# Altium footprint library MYLIB.PcbLib: 600 footprints (part 31 of 39)
Each footprint in its own frame and in the unit in brackets; x right, y up, seen from the top. Pads: shape width x height; smd on the part's side, far side on the other; paste and mask are expansions set on the pad; w line width, h text height; cw(c..) or ccw(c..) is an arc to the next point about the centre after c.
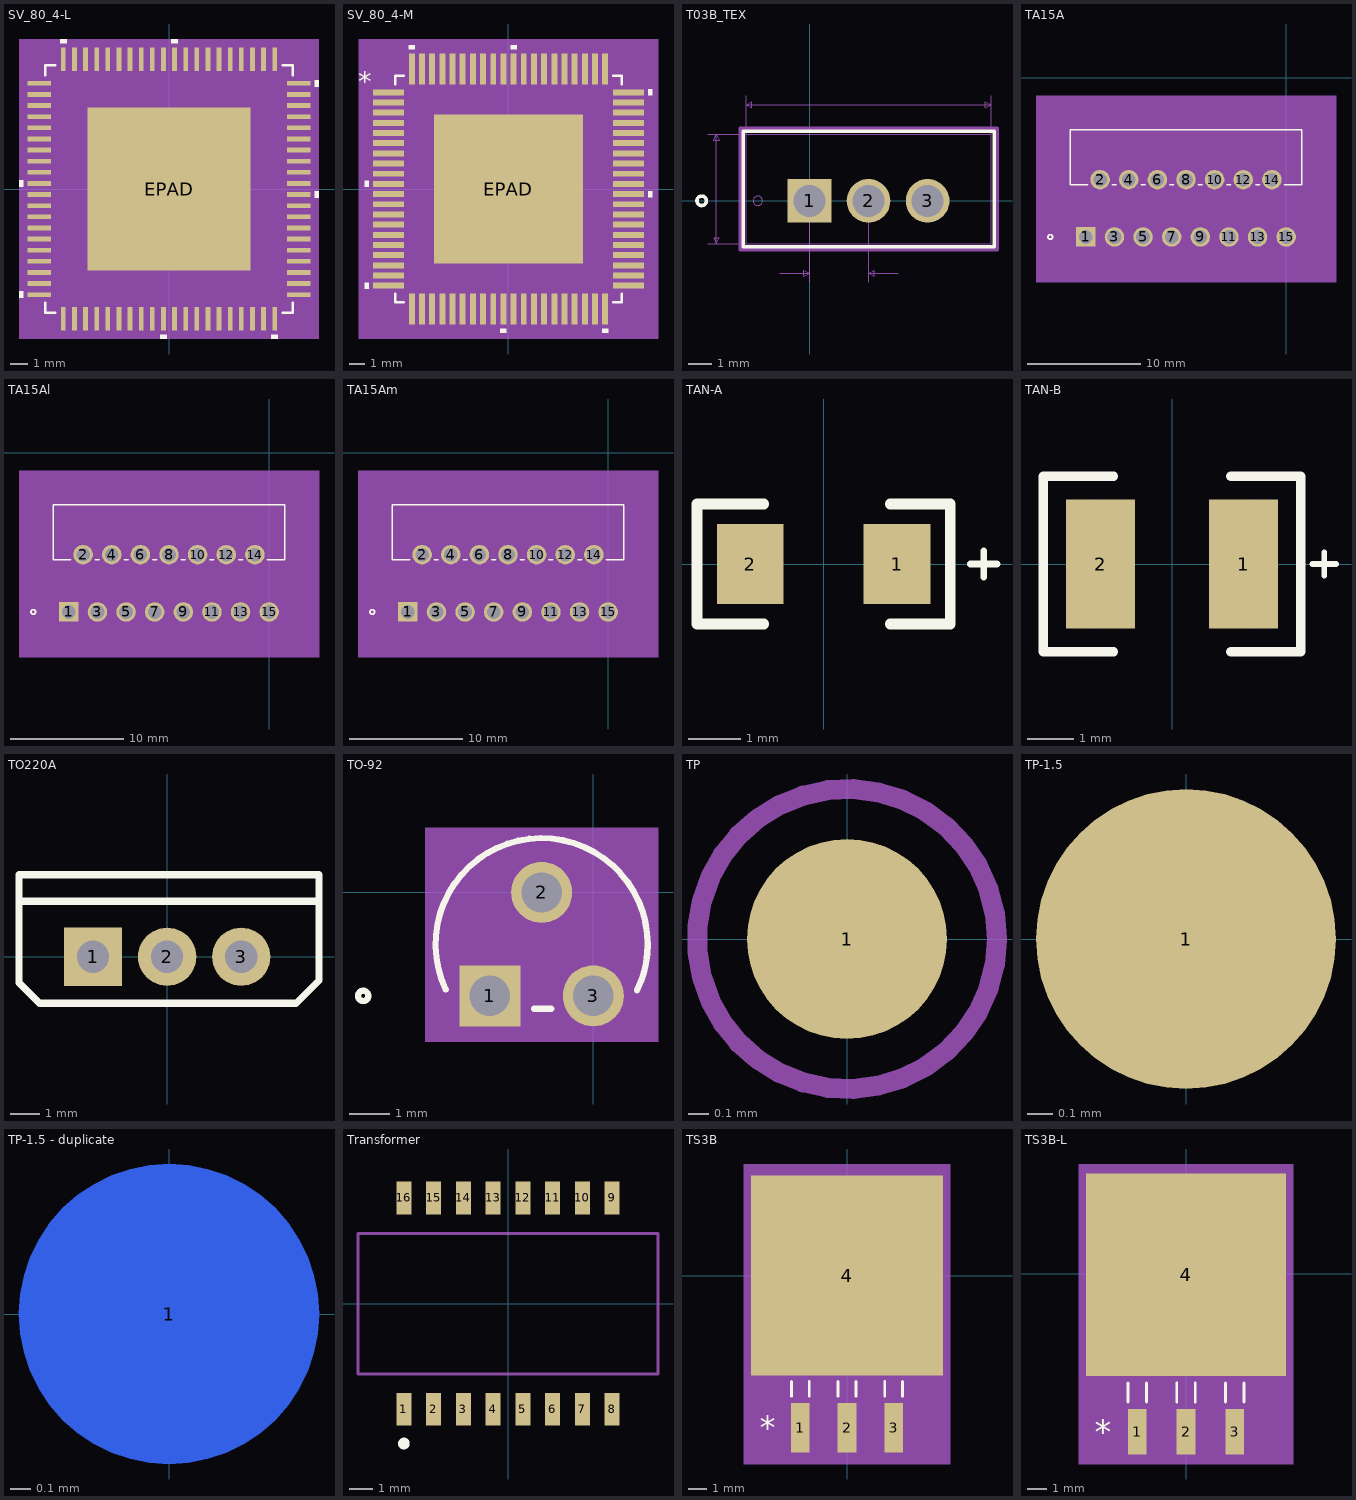
[diagram p30: the footprints below, top view; thin cyan lines are the x and y axes]

## SV_80_4-L [mil]
pads (81):
  rect 54x11 smd paste+0 mask+0: 1(-298,243.11) 2(-298,217.52) 3(-298,191.93) 4(-298,166.34) 5(-298,140.75) 6(-298,115.16) 7(-298,89.57) 8(-298,63.98) 9(-298,38.39) 10(-298,12.8) 11(-298,-12.8) 12(-298,-38.39) 13(-298,-63.98) 14(-298,-89.57) 15(-298,-115.16) 16(-298,-140.75) 17(-298,-166.34) 18(-298,-191.93) 19(-298,-217.52) 20(-298,-243.11) 41(298,-243.11) 42(298,-217.52) 43(298,-191.93) 44(298,-166.34) 45(298,-140.75) 46(298,-115.16) 47(298,-89.57) 48(298,-63.98) 49(298,-38.39) 50(298,-12.8) 51(298,12.8) 52(298,38.39) 53(298,63.98) 54(298,89.57) 55(298,115.16) 56(298,140.75) 57(298,166.34) 58(298,191.93) 59(298,217.52) 60(298,243.11)
  rect 11x54 smd paste+0 mask+0: 21(-243.11,-298) 22(-217.52,-298) 23(-191.93,-298) 24(-166.34,-298) 25(-140.75,-298) 26(-115.16,-298) 27(-89.57,-298) 28(-63.98,-298) 29(-38.39,-298) 30(-12.8,-298) 31(12.8,-298) 32(38.39,-298) 33(63.98,-298) 34(89.57,-298) 35(115.16,-298) 36(140.75,-298) 37(166.34,-298) 38(191.93,-298) 39(217.52,-298) 40(243.11,-298) 61(243.11,298) 62(217.52,298) 63(191.93,298) 64(166.34,298) 65(140.75,298) 66(115.16,298) 67(89.57,298) 68(63.98,298) 69(38.39,298) 70(12.8,298) 71(-12.8,298) 72(-38.39,298) 73(-63.98,298) 74(-89.57,298) 75(-115.16,298) 76(-140.75,298) 77(-166.34,298) 78(-191.93,298) 79(-217.52,298) 80(-243.11,298)
  rect 374x374 smd paste-186.5 mask+0: EPAD(0,0)
Top Overlay:
  region: -335,20.3 -345,20.3 -345,5.3 -335,5.3
  region: -335,-235.61 -345,-235.61 -345,-250.61 -335,-250.61
  region: -5.3,-335 -20.3,-335 -20.3,-345 -5.3,-345
  region: 250.61,-335 235.61,-335 235.61,-345 250.61,-345
  region: 335,-5.3 345,-5.3 345,-20.3 335,-20.3
  region: 335,250.61 345,250.61 345,235.61 335,235.61
  region: 20.3,335 5.3,335 5.3,345 20.3,345
  region: -235.61,335 -250.61,335 -250.61,345 -235.61,345
  lines w6: -284.5,-261.71 -284.5,-284.5 -261.71,-284.5 ; -284.5,261.71 -284.5,284.5 -261.71,284.5 ; 261.71,-284.5 284.5,-284.5 284.5,-261.71 ; 261.71,284.5 284.5,284.5 284.5,261.71
Top Paste:
  drawing of 49 lines, arcs and shapes, not listed
Mechanical 5:
  region: 344,-344 -344,-344 -344,344 344,344
Mechanical 13:
  drawing of 325 lines, arcs and shapes, not listed
  text "*" at -277,230.91 h50
Mechanical 15:
  region: -252.61,-283.5 -283.5,-283.5 -283.5,-252.61 -329,-252.61 -329,252.61 -283.5,252.61 -283.5,283.5 -252.61,283.5 -252.61,329 252.61,329 252.61,283.5 283.5,283.5 283.5,252.61 329,252.61 329,-252.61 283.5,-252.61 283.5,-283.5 252.61,-283.5 252.61,-329 -252.61,-329
  lines w6: -329,-252.61 -283.5,-252.61 -283.5,-283.5 -252.61,-283.5 -252.61,-329 252.61,-329 252.61,-283.5 283.5,-283.5 283.5,-252.61 329,-252.61 329,252.61 283.5,252.61 283.5,283.5 252.61,283.5 252.61,329 -252.61,329 -252.61,283.5 -283.5,283.5 -283.5,252.61 -329,252.61 -329,-252.61
3D body: height 10, standoff 0, extent 0,0 10,10

## SV_80_4-M [mil]
pads (81):
  rect 78x15 smd paste+0 mask+0: 1(-302,243.11) 2(-302,217.52) 3(-302,191.93) 4(-302,166.34) 5(-302,140.75) 6(-302,115.16) 7(-302,89.57) 8(-302,63.98) 9(-302,38.39) 10(-302,12.8) 11(-302,-12.8) 12(-302,-38.39) 13(-302,-63.98) 14(-302,-89.57) 15(-302,-115.16) 16(-302,-140.75) 17(-302,-166.34) 18(-302,-191.93) 19(-302,-217.52) 20(-302,-243.11) 41(302,-243.11) 42(302,-217.52) 43(302,-191.93) 44(302,-166.34) 45(302,-140.75) 46(302,-115.16) 47(302,-89.57) 48(302,-63.98) 49(302,-38.39) 50(302,-12.8) 51(302,12.8) 52(302,38.39) 53(302,63.98) 54(302,89.57) 55(302,115.16) 56(302,140.75) 57(302,166.34) 58(302,191.93) 59(302,217.52) 60(302,243.11)
  rect 15x78 smd paste+0 mask+0: 21(-243.11,-302) 22(-217.52,-302) 23(-191.93,-302) 24(-166.34,-302) 25(-140.75,-302) 26(-115.16,-302) 27(-89.57,-302) 28(-63.98,-302) 29(-38.39,-302) 30(-12.8,-302) 31(12.8,-302) 32(38.39,-302) 33(63.98,-302) 34(89.57,-302) 35(115.16,-302) 36(140.75,-302) 37(166.34,-302) 38(191.93,-302) 39(217.52,-302) 40(243.11,-302) 61(243.11,302) 62(217.52,302) 63(191.93,302) 64(166.34,302) 65(140.75,302) 66(115.16,302) 67(89.57,302) 68(63.98,302) 69(38.39,302) 70(12.8,302) 71(-12.8,302) 72(-38.39,302) 73(-63.98,302) 74(-89.57,302) 75(-115.16,302) 76(-140.75,302) 77(-166.34,302) 78(-191.93,302) 79(-217.52,302) 80(-243.11,302)
  rect 374x374 smd paste-186.5 mask+0: EPAD(0,0)
Top Overlay:
  region: -351,20.3 -361,20.3 -361,5.3 -351,5.3
  region: -351,-235.61 -361,-235.61 -361,-250.61 -351,-250.61
  region: -5.3,-351 -20.3,-351 -20.3,-361 -5.3,-361
  region: 250.61,-351 235.61,-351 235.61,-361 250.61,-361
  region: 351,-5.3 361,-5.3 361,-20.3 351,-20.3
  region: 351,250.61 361,250.61 361,235.61 351,235.61
  region: 20.3,351 5.3,351 5.3,361 20.3,361
  region: -235.61,351 -250.61,351 -250.61,361 -235.61,361
  lines w6: -284.5,-263.71 -284.5,-284.5 -263.71,-284.5 ; -284.5,263.71 -284.5,284.5 -263.71,284.5 ; 263.71,-284.5 284.5,-284.5 284.5,-263.71 ; 263.71,284.5 284.5,284.5 284.5,263.71
  text "*" at -378.5,245.91 h50
Top Paste:
  drawing of 49 lines, arcs and shapes, not listed
Mechanical 5:
  region: 376,-376 -376,-376 -376,376 376,376
Mechanical 13:
  drawing of 325 lines, arcs and shapes, not listed
  text "*" at -277,230.91 h50
Mechanical 15:
  region: -270.61,-299.5 -299.5,-299.5 -299.5,-270.61 -361,-270.61 -361,270.61 -299.5,270.61 -299.5,299.5 -270.61,299.5 -270.61,361 270.61,361 270.61,299.5 299.5,299.5 299.5,270.61 361,270.61 361,-270.61 299.5,-270.61 299.5,-299.5 270.61,-299.5 270.61,-361 -270.61,-361
  lines w6: -361,-270.61 -299.5,-270.61 -299.5,-299.5 -270.61,-299.5 -270.61,-361 270.61,-361 270.61,-299.5 299.5,-299.5 299.5,-270.61 361,-270.61 361,270.61 299.5,270.61 299.5,299.5 270.61,299.5 270.61,361 -270.61,361 -270.61,299.5 -299.5,299.5 -299.5,270.61 -361,270.61 -361,-270.61
3D body: height 10, standoff 0, extent 0,0 10,10

## T03B_TEX [mil]
pads (3):
  rect 74x74 hole 54: 1(0,0)
  round 74 hole 54: 2(100,0) 3(200,0)
Top Overlay:
  circle w6: c-182.5,0 r8
  lines w6: -112.5,-77.5 312.5,-77.5 312.5,117.5 -112.5,117.5 -112.5,-77.5
Mechanical 7:
  lines w1: -172.5,-72.5 -107.5,-72.5 ; -172.5,112.5 -107.5,112.5 ; -107.5,20 -107.5,177.5 ; -50,-122.5 0,-122.5 ; 0,-137.5 0,0 ; 100,-137.5 100,0 ; 150,-122.5 100,-122.5 ; 307.5,20 307.5,177.5 ; -157.5,-72.5 -157.5,112.5 ; -157.5,-72.5 -162.5,-62.5 -152.5,-62.5 -157.5,-72.5 ; -157.5,112.5 -162.5,102.5 -152.5,102.5 -157.5,112.5 ; -107.5,162.5 307.5,162.5 ; -107.5,162.5 -97.5,167.5 -97.5,157.5 -107.5,162.5 ; 0,-122.5 -10,-117.5 -10,-127.5 0,-122.5 ; 100,-122.5 110,-117.5 110,-127.5 100,-122.5 ; 307.5,162.5 297.5,167.5 297.5,157.5 307.5,162.5
  text "0.415in/10.541mm" at 0,182.5 h25
  text "0.1in/2.54mm" at -25,-167.5 h25
Mechanical 13:
  circle w0: c-87.5,0 r8
  lines w1: -107.5,-72.5 307.5,-72.5 307.5,112.5 -107.5,112.5 -107.5,-72.5
  lines w6: -10,0 10,0 ; 0,-10 0,10
Mechanical 15:
  lines w6: -117.5,-82.5 -117.5,122.5 317.5,122.5 317.5,-82.5 -117.5,-82.5
3D body: height 10, standoff 0, extent 0,0 10,10

## TA15A [mil]
pads (15):
  rect 68x68 hole 48: 1(-700,-556)
  round 68 hole 48: 2(-650,-356) 3(-600,-556) 4(-550,-356) 5(-500,-556) 6(-450,-356) 7(-400,-556) 8(-350,-356) 9(-300,-556) 10(-250,-356) 11(-200,-556) 12(-150,-356) 13(-100,-556) 14(-50,-356) 15(0,-556)
Top Overlay:
  circle w6: c-824,-556 r8
  lines w6: -693.52,-374 -754,-374 -754,-182 54,-182 54,-374 -6.48,-374 ; -606.48,-374 -593.52,-374 ; -506.48,-374 -493.52,-374 ; -406.48,-374 -393.52,-374 ; -306.48,-374 -293.52,-374 ; -206.48,-374 -193.52,-374 ; -106.48,-374 -93.52,-374
Mechanical 5:
  region: -874,-62 174,-62 174,-715 -874,-715
Mechanical 13:
  circle w0: c-739,-359 r8
  lines w1: -749,-369 -749,-187 49,-187 49,-369 -749,-369
Mechanical 15:
  region: 59,-177 -759,-177 -759,-600 59,-600
  lines w6: -759,-600 59,-600 59,-177 -759,-177 -759,-600
3D body: height 10, standoff 0, extent 0,0 10,10

## TA15Al [mil]
pads (15):
  rect 68x68 hole 48: 1(-700,-556)
  round 68 hole 48: 2(-650,-356) 3(-600,-556) 4(-550,-356) 5(-500,-556) 6(-450,-356) 7(-400,-556) 8(-350,-356) 9(-300,-556) 10(-250,-356) 11(-200,-556) 12(-150,-356) 13(-100,-556) 14(-50,-356) 15(0,-556)
Top Overlay:
  circle w6: c-824,-556 r8
  lines w6: -693.52,-374 -754,-374 -754,-182 54,-182 54,-374 -6.48,-374 ; -606.48,-374 -593.52,-374 ; -506.48,-374 -493.52,-374 ; -406.48,-374 -393.52,-374 ; -306.48,-374 -293.52,-374 ; -206.48,-374 -193.52,-374 ; -106.48,-374 -93.52,-374
Mechanical 5:
  region: -874,-62 174,-62 174,-715 -874,-715
Mechanical 13:
  circle w0: c-739,-359 r8
  lines w1: -749,-369 49,-369 49,-187 -749,-187 -749,-369
Mechanical 15:
  region: 59,-177 -759,-177 -759,-600 59,-600
  lines w6: -759,-600 -759,-177 59,-177 59,-600 -759,-600
3D body: height 10, standoff 0, extent 0,0 10,10

## TA15Am [mil]
pads (15):
  rect 68x68 hole 48: 1(-700,-556)
  round 68 hole 48: 2(-650,-356) 3(-600,-556) 4(-550,-356) 5(-500,-556) 6(-450,-356) 7(-400,-556) 8(-350,-356) 9(-300,-556) 10(-250,-356) 11(-200,-556) 12(-150,-356) 13(-100,-556) 14(-50,-356) 15(0,-556)
Top Overlay:
  circle w6: c-824,-556 r8
  lines w6: -693.52,-374 -754,-374 -754,-182 54,-182 54,-374 -6.48,-374 ; -606.48,-374 -593.52,-374 ; -506.48,-374 -493.52,-374 ; -406.48,-374 -393.52,-374 ; -306.48,-374 -293.52,-374 ; -206.48,-374 -193.52,-374 ; -106.48,-374 -93.52,-374
Mechanical 5:
  region: -874,-62 174,-62 174,-715 -874,-715
Mechanical 13:
  circle w0: c-739,-359 r8
  lines w1: -749,-369 -749,-187 49,-187 49,-369 -749,-369
Mechanical 15:
  region: 59,-177 -759,-177 -759,-600 59,-600
  lines w6: -759,-600 59,-600 59,-177 -759,-177 -759,-600
3D body: height 10, standoff 0, extent 0,0 10,10

## TAN-A [mil] "TAN Capacitor"
height 39.37
pads (2):
  rect 50x60 smd: 1(55,0) 2(-55,0)
Top Overlay:
  lines w5: 110,0 130,0 ; 120,-10 120,10
  lines w8: -45,-45 -95,-45 -95,45 -45,45 ; 50,-45 95,-45 95,45 50,45
3D body: height 39.37, standoff 0, extent -47.24,-35.43 47.24,35.43

## TAN-B [mm] "Tan Capacitor"
height 1
pads (2):
  rect 1.5x2.8 smd: 1(1.55,0) 2(-1.55,0)
Top Overlay:
  lines w0.127: 3.048,0 3.556,0 ; 3.302,-0.254 3.302,0.254
  lines w0.203: -1.27,-1.905 -2.794,-1.905 -2.794,1.905 -1.27,1.905 ; 1.27,-1.905 2.794,-1.905 2.794,1.905 1.27,1.905
Mechanical 13:
  lines w0.1: -1.7,-1.35 -1.7,1.35 ; 1.7,-1.35 1.7,1.35
3D body: height 1, standoff 0, extent -1.763,-1.537 1.704,1.539

## TO220A [mm] "220，3脚晶体管"
pads (3):
  rect 2x2 hole 1.1: 1(-2.54,0)
  round 2 hole 1.1: 2(0,0) 3(2.54,0)
Top Overlay:
  lines w0.254: -4.928,1.905 5.131,1.905 ; -5.08,-0.889 -5.08,2.819 5.207,2.819 5.207,-0.813 4.42,-1.6 -4.369,-1.6 -5.08,-0.889
3D body "TO220A.STEP": height 18.5, standoff -4, extent -5.15,-1.53 5.15,2.9

## TO-92 [mil]
pads (3):
  rect 59x59 hole 39 mask+0: 1(-100,-100)
  round 59 hole 39 mask+0: 2(-50,0) 3(0,-100)
Top Overlay:
  circle w6: c-222.5,-100 r5
  lines w6: -142.6,-93.95 cw(c-50,-50) 52.5,-50 cw(c-50,-50) 42.26,-94.65 ; -57.4,-112.5 -40.72,-112.5
Mechanical 5:
  region: -162.5,62.5 62.5,62.5 62.5,-144.5 -162.5,-144.5
Mechanical 13:
  circle w0: c-137.5,-100 r5
  lines w0: -128.74,-107.5 cw(c-50,-50) 28.74,-107.5
  lines w1: -128.74,-107.5 28.74,-107.5
  lines w6: -110,-100 -90,-100 ; -100,-110 -100,-90
3D body: height 10, standoff 0, extent 0,0 10,10

## TP [mm] "Testpoint, Surface Mounting, Circular, Pad Diameter 1mm"
height 1
pads (1):
  round 1 smd: 1(0,0)
Mechanical 15:
  circle w0.1: c0,0 r0.75

## TP-1.5 [mm]
pads (1):
  round 1.2 smd: 1(0,0)

## TP-1.5 - duplicate [mm]
pads (1):
  round 1.5 smd far side: 1(0,0)

## Transformer [mm]
height 1
pads (16):
  rect 0.64x1.4 smd: 1(-4.445,-4.51) 2(-3.175,-4.51) 3(-1.905,-4.51) 4(-0.635,-4.51) 5(0.635,-4.51) 6(1.905,-4.51) 7(3.175,-4.51) 8(4.445,-4.51) 9(4.445,4.51) 10(3.175,4.51) 11(1.905,4.51) 12(0.635,4.51) 13(-0.635,4.51) 14(-1.905,4.51) 15(-3.175,4.51) 16(-4.445,4.51)
Top Overlay:
  circle w0.25: c-4.443,-5.969 r0.125
Mechanical 13:
  lines w0.127: -6.4,-3 -6.4,3 6.4,3 6.4,-3 -6.4,-3
3D body: height 6, standoff 0, extent -6.4,-3 6.4,3

## TS3B [mil]
pads (4):
  rect 40x106 smd paste+0 mask+0: 1(-100,-326) 2(0,-326) 3(100,-326)
  rect 412x428 smd paste+0 mask+0: 4(0,0)
Top Overlay:
  lines w6: -119,-259 -119,-227.1 ; -81,-259 -81,-227.1 ; -19,-259 -19,-227.1 ; 19,-259 19,-227.1 ; 81,-259 81,-227.1 ; 119,-259 119,-227.1
  text "*" at -187.5,-351 h50
Mechanical 5:
  region: -221,239 221,239 221,-404 -221,-404
Mechanical 13:
  lines w1: -205,-200 -205,200 205,200 205,-200 -205,-200 ; -119,-365 -81,-365 -81,-200 -119,-200 -119,-365 ; -19,-365 19,-365 19,-200 -19,-200 -19,-365 ; 81,-365 119,-365 119,-200 81,-200 81,-365
  text "*" at -112.5,-215 h50
Mechanical 15:
  region: -130,-224 -216,-224 -216,224 216,224 216,-224 130,-224 130,-389 -130,-389
  lines w6: -216,-224 -130,-224 -130,-389 130,-389 130,-224 216,-224 216,224 -216,224 -216,-224
3D body: height 10, standoff 0, extent 0,0 10,10

## TS3B-L [mil]
pads (4):
  rect 38x94 smd paste+0 mask+0: 1(-100,-324) 2(0,-324) 3(100,-324)
  rect 410x416 smd paste+0 mask+0: 4(0,-2)
Top Overlay:
  lines w6: -119,-263 -119,-224 ; -81,-263 -81,-224 ; -19,-263 -19,-224 ; 19,-263 19,-224 ; 81,-263 81,-224 ; 119,-263 119,-224
  text "*" at -187.5,-349 h50
Mechanical 5:
  region: -220,225 220,225 220,-390 -220,-390
Mechanical 13:
  lines w1: -205,-200 205,-200 205,200 -205,200 -205,-200 ; -119,-365 -119,-200 -81,-200 -81,-365 -119,-365 ; -19,-365 -19,-200 19,-200 19,-365 -19,-365 ; 81,-365 81,-200 119,-200 119,-365 81,-365
  text "*" at -112.5,-215 h50
Mechanical 15:
  region: -123,-214 -209,-214 -209,210 209,210 209,-214 123,-214 123,-375 -123,-375
  lines w6: -209,-214 -209,210 209,210 209,-214 123,-214 123,-375 -123,-375 -123,-214 -209,-214
3D body: height 10, standoff 0, extent 0,0 10,10